# Altium footprint library XU-GENARAL PCB .PcbLib: 1176 footprints (part 19 of 75)
Each footprint in its own frame and in the unit in brackets; x right, y up, seen from the top. Pads: shape width x height; smd on the part's side, far side on the other; paste and mask are expansions set on the pad; w line width, h text height; cw(c..) or ccw(c..) is an arc to the next point about the centre after c.
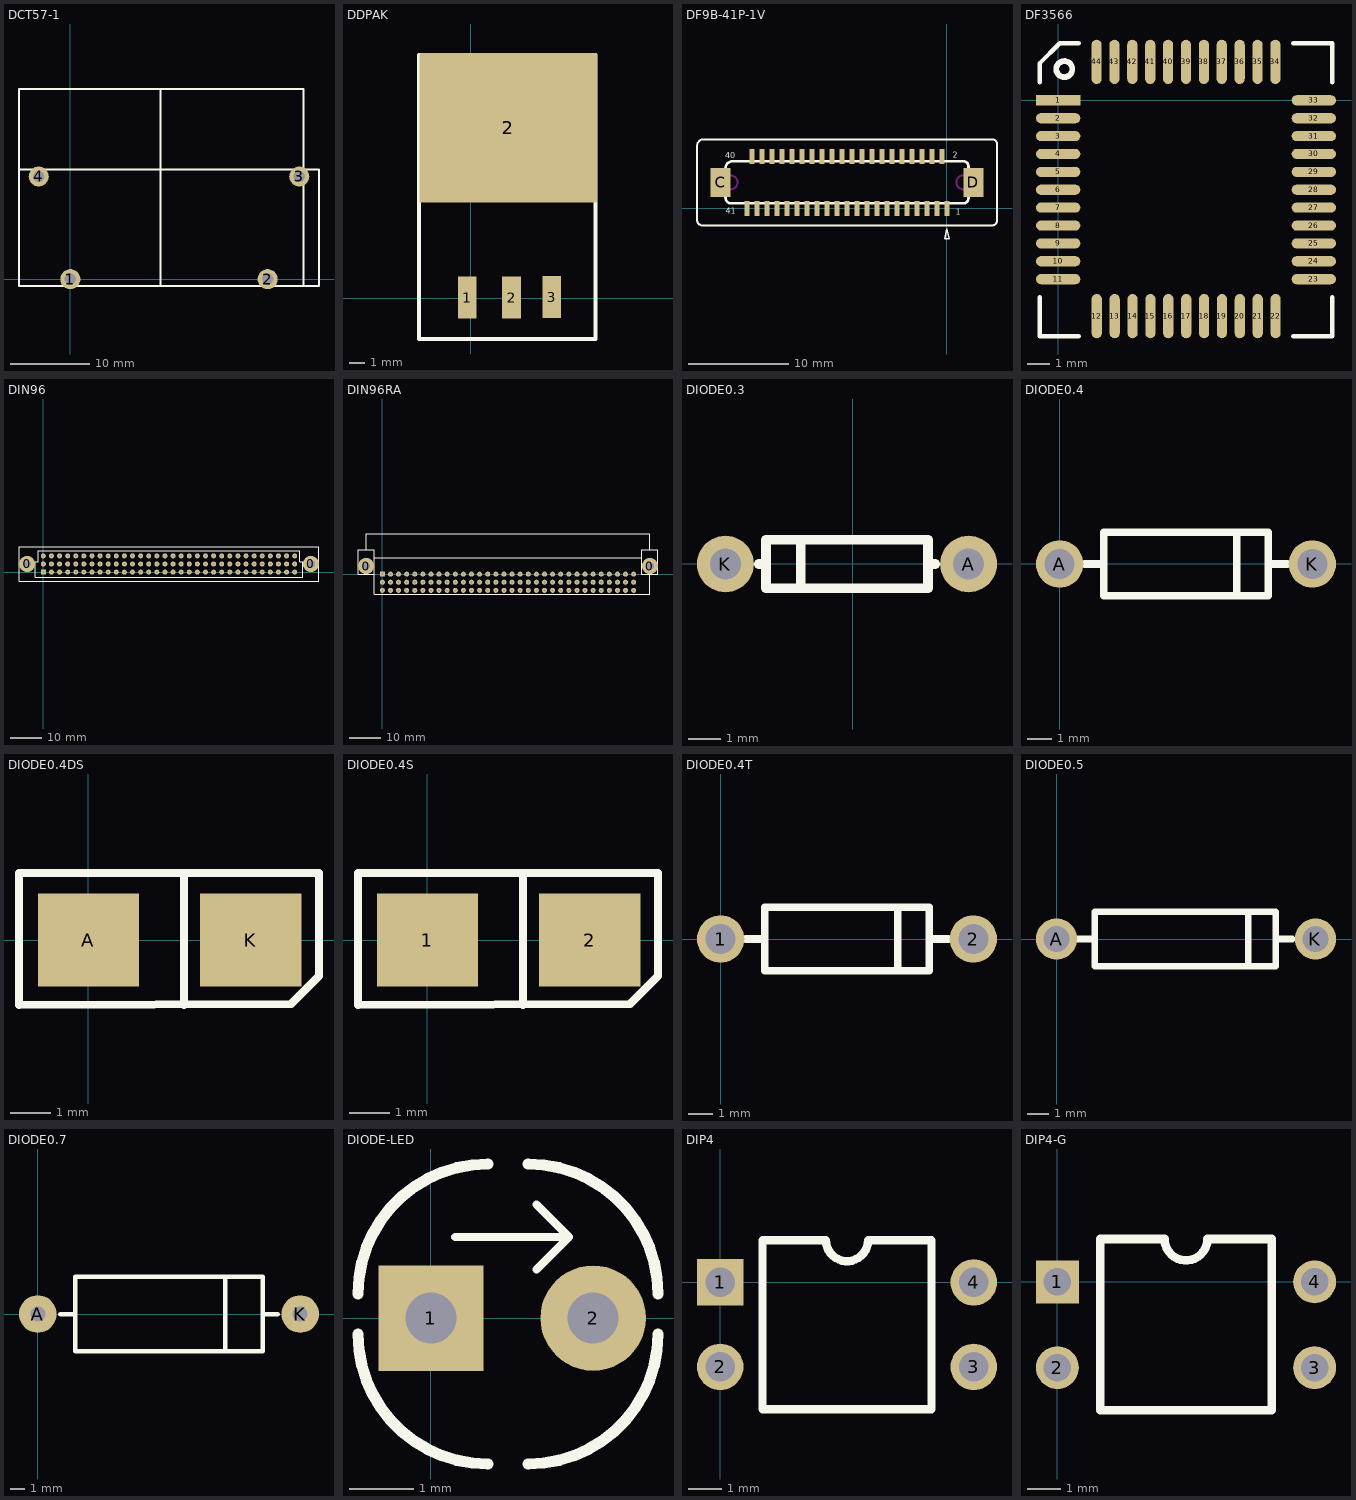
[diagram p18: the footprints below, top view; thin cyan lines are the x and y axes]

## DCT57-1 [mil]
pads (4):
  round 100 hole 56: 1(0,0) 2(984.25,0) 3(1141.73,511.81) 4(-157.48,511.81)
Top Overlay:
  lines w10: 450.1,-35.43 450.1,948.82 ; 1161.42,-35.43 -255.91,-35.43 ; 1162.1,-35.43 1162.1,948.82 -255.91,948.82 -255.91,547.24 ; -255.91,-35.43 -255.91,547.24 ; -255.91,-35.43 1240.16,-35.43 1240.16,547.24 -255.91,547.24

## DDPAK [mil]
pads (4):
  rect 47.24x106.61 smd: 1(-9,1) 2(103,1) 3(205,2)
  rect 450x380 smd: 2(95,432)
Top Overlay:
  lines w10: -132,-104 -132,616 316,616 316,-104 -132,-104

## DF9B-41P-1V [mm]
pads (43):
  rect 0.5x1.5 smd: 1(0,0) 2(-0.5,5.2) 3(-1,0) 4(-1.5,5.2) 5(-2,0) 6(-2.5,5.2) 7(-3,0) 8(-3.5,5.2) 9(-4,0) 10(-4.5,5.2) 11(-5,0) 12(-5.5,5.2) 13(-6,0) 14(-6.5,5.2) 15(-7,0) 16(-7.5,5.2) 17(-8,0) 18(-8.5,5.2) 19(-9,0) 20(-9.5,5.2) 21(-10,0) 22(-10.5,5.2) 23(-11,0) 24(-11.5,5.2) 25(-12,0) 26(-12.5,5.2) 27(-13,0) 28(-13.5,5.2) 29(-14,0) 30(-14.5,5.2) 31(-15,0) 32(-15.5,5.2) 33(-16,0) 34(-16.5,5.2) 35(-17,0) 36(-17.5,5.2) 37(-18,0) 38(-18.5,5.2) 39(-19,0) 40(-19.5,5.2) 41(-20,0)
  rect 2x2.9 smd: C(-22.65,2.6) D(2.65,2.6)
Top Overlay:
  lines w0.127: -0.25,-3.032 0.25,-3.032 0,-2.032 -0.25,-3.032
  lines w0.2: -25,-1.162 ccw(c-24.465,-1.162) -24.465,-1.697 4.526,-1.697 ccw(c4.526,-1.223) 5,-1.223 5,6.43 ccw(c4.527,6.43) 4.527,6.903 -24.339,6.903 ccw(c-24.339,6.242) -25,6.242 -25,-1.162
  lines w0.254: -22.15,1.06 ccw(c-21.59,1.06) -21.59,0.5 1.643,0.5 ccw(c1.643,1.007) 2.15,1.007 2.15,4.2 ccw(c1.65,4.2) 1.65,4.7 -21.462,4.7 ccw(c-21.462,4.012) -22.15,4.012 -22.15,1.06
  text "40" at -22.175,5.025 h0.6
  text "41" at -22.15,-0.55 h0.6
  text "1" at 0.85,-0.625 h0.6
  text "2" at 0.6,5.075 h0.6
Keep-Out Layer:
  circle w0.2: c1.65,2.6 r0.7
  circle w0.2: c-21.65,2.6 r0.7

## DF3566 [mil]
pads (44):
  rect 78x18 smd: 1(0,0)
  oval 78x18 smd: 2(0,-31.5) 3(0,-62.99) 4(0,-94.49) 5(0,-125.98) 6(0,-157.48) 7(0,-188.98) 8(0,-220.47) 9(0,-251.97) 10(0,-283.46) 11(0,-314.96) 23(450.31,-314.96) 24(450.31,-283.46) 25(450.31,-251.97) 26(450.31,-220.47) 27(450.31,-188.98) 28(450.31,-157.48) 29(450.31,-125.98) 30(450.31,-94.49) 31(450.31,-62.99) 32(450.31,-31.5) 33(450.31,0)
  oval 18x78 smd: 12(68.03,-380) 13(99.53,-380) 14(131.02,-380) 15(162.52,-380) 16(194.02,-380) 17(225.51,-380) 18(257.01,-380) 19(288.5,-380) 20(320,-380) 21(351.5,-380) 22(382.99,-380) 34(382.64,67.68) 35(351.14,67.68) 36(319.65,67.68) 37(288.15,67.68) 38(256.65,67.68) 39(225.16,67.68) 40(193.66,67.68) 41(162.17,67.68) 42(130.67,67.68) 43(99.17,67.68) 44(67.68,67.68)
Top Overlay:
  circle w10: c10.86,55 r14.14
  lines w7.87: -32.72,-346.46 -32.72,-415.36 36.18,-415.36 ; -32.72,31.5 -32.72,64.96 2.72,100.39 36.18,100.39 ; 414.13,-415.36 483.03,-415.36 483.03,-346.46 ; 414.13,100.39 483.03,100.39 483.03,31.5

## DIN96 [mil]
pads (98):
  round 200 hole 100: 0(-200,100) 0(3300,100)
  rect 62x62 hole 25: 1A(0,0)
  round 62 hole 25: 1B(0,100) 1C(0,200) 2A(100,0) 2B(100,100) 2C(100,200) 3A(200,0) 3B(200,100) 3C(200,200) 4A(300,0) 4B(300,100) 4C(300,200) 5A(400,0) 5B(400,100) 5C(400,200) 6A(500,0) 6B(500,100) 6C(500,200) 7A(600,0) 7B(600,100) 7C(600,200) 8A(700,0) 8B(700,100) 8C(700,200) 9A(800,0) 9B(800,100) 9C(800,200) 10A(900,0) 10B(900,100) 10C(900,200) 11A(1000,0) 11B(1000,100) 11C(1000,200) 12A(1100,0) 12B(1100,100) 12C(1100,200) 13A(1200,0) 13B(1200,100) 13C(1200,200) 14A(1300,0) 14B(1300,100) 14C(1300,200) 15A(1400,0) 15B(1400,100) 15C(1400,200) 16A(1500,0) 16B(1500,100) 16C(1500,200) 17A(1600,0) 17B(1600,100) 17C(1600,200) 18A(1700,0) 18B(1700,100) 18C(1700,200) 19A(1800,0) 19B(1800,100) 19C(1800,200) 20A(1900,0) 20B(1900,100) 20C(1900,200) 21A(2000,0) 21B(2000,100) 21C(2000,200) 22A(2100,0) 22B(2100,100) 22C(2100,200) 23A(2200,0) 23B(2200,100) 23C(2200,200) 24A(2300,0) 24B(2300,100) 24C(2300,200) 25A(2400,0) 25B(2400,100) 25C(2400,200) 26A(2500,0) 26B(2500,100) 26C(2500,200) 27A(2600,0) 27B(2600,100) 27C(2600,200) 28A(2700,0) 28B(2700,100) 28C(2700,200) 29A(2800,0) 29B(2800,100) 29C(2800,200) 30A(2900,0) 30B(2900,100) 30C(2900,200) 31A(3000,0) 31B(3000,100) 31C(3000,200) 32A(3100,0) 32B(3100,100) 32C(3100,200)
Top Overlay:
  lines w10: -300,-110 3400,-110 3400,310 -300,310 -300,-110 ; -100,-65 3200,-65 3200,130 3165,130 3165,265 -65,265 -65,130 -100,130 -100,-65

## DIN96RA [mil]
pads (98):
  round 200 hole 100: 0(-200,100) 0(3300,100)
  rect 62x62 hole 25: 1A(0,0)
  round 62 hole 25: 1B(0,-100) 1C(0,-200) 2A(100,0) 2B(100,-100) 2C(100,-200) 3A(200,0) 3B(200,-100) 3C(200,-200) 4A(300,0) 4B(300,-100) 4C(300,-200) 5A(400,0) 5B(400,-100) 5C(400,-200) 6A(500,0) 6B(500,-100) 6C(500,-200) 7A(600,0) 7B(600,-100) 7C(600,-200) 8A(700,0) 8B(700,-100) 8C(700,-200) 9A(800,0) 9B(800,-100) 9C(800,-200) 10A(900,0) 10B(900,-100) 10C(900,-200) 11A(1000,0) 11B(1000,-100) 11C(1000,-200) 12A(1100,0) 12B(1100,-100) 12C(1100,-200) 13A(1200,0) 13B(1200,-100) 13C(1200,-200) 14A(1300,0) 14B(1300,-100) 14C(1300,-200) 15A(1400,0) 15B(1400,-100) 15C(1400,-200) 16A(1500,0) 16B(1500,-100) 16C(1500,-200) 17A(1600,0) 17B(1600,-100) 17C(1600,-200) 18A(1700,0) 18B(1700,-100) 18C(1700,-200) 19A(1800,0) 19B(1800,-100) 19C(1800,-200) 20A(1900,0) 20B(1900,-100) 20C(1900,-200) 21A(2000,0) 21B(2000,-100) 21C(2000,-200) 22A(2100,0) 22B(2100,-100) 22C(2100,-200) 23A(2200,0) 23B(2200,-100) 23C(2200,-200) 24A(2300,0) 24B(2300,-100) 24C(2300,-200) 25A(2400,0) 25B(2400,-100) 25C(2400,-200) 26A(2500,0) 26B(2500,-100) 26C(2500,-200) 27A(2600,0) 27B(2600,-100) 27C(2600,-200) 28A(2700,0) 28B(2700,-100) 28C(2700,-200) 29A(2800,0) 29B(2800,-100) 29C(2800,-200) 30A(2900,0) 30B(2900,-100) 30C(2900,-200) 31A(3000,0) 31B(3000,-100) 31C(3000,-200) 32A(3100,0) 32B(3100,-100) 32C(3100,-200)
Top Overlay:
  lines w10: -100,200 3200,200 ; 3300,0 3300,-250 -100,-250 -100,0 ; -200,300 -100,300 -100,0 ; -200,300 -300,300 -300,0 -100,0 ; -200,300 -200,500 3300,500 3300,300 ; 3300,300 3400,300 3400,0 3200,0 3200,300 3300,300

## DIODE0.3 [mil]
pads (2):
  round 70 hole 38: A(142.74,-0.26) K(-157.26,-0.26)
Top Overlay:
  lines w12: -116.26,-0.26 -107.26,-0.26 ; -64.26,-29.26 -64.26,29.74 ; 92.74,-0.26 101.74,-0.26 ; -107.26,-0.26 -107.26,29.74 92.74,29.74 92.74,-30.26 -107.26,-30.26 -107.26,-0.26

## DIODE0.4 [mm]
pads (2):
  round 1.9 hole 1.2: A(-0.004,-0.013) K(10.156,-0.013)
Top Overlay:
  lines w0.305: 1.012,-0.013 1.774,-0.013 ; 7.108,-1.283 7.108,1.257 ; 8.378,-0.013 9.14,-0.013 ; 1.774,-1.283 1.774,1.257 8.378,1.257 8.378,-1.283 1.774,-1.283

## DIODE0.4DS [mm]
pads (2):
  rect 2.5x2.286 smd: A(0,0) K(4,0)
Top Overlay:
  lines w0.2: 2.356,-1.6 2.356,1.651 ; 4.997,-1.575 -1.708,-1.6 -1.713,0 -1.708,1.651 5.683,1.651 5.683,-0.838
  lines w0.203: 4.997,-1.575 5.683,-0.889 5.683,-0.838

## DIODE0.4S [mm]
pads (2):
  rect 2.5x2.286 smd: 1(0,0) 2(4,0)
Top Overlay:
  lines w0.2: 2.356,-1.6 2.356,1.651 ; 4.997,-1.575 -1.708,-1.6 -1.713,0 -1.708,1.651 5.683,1.651 5.683,-0.838
  lines w0.203: 4.997,-1.575 5.683,-0.889 5.683,-0.838

## DIODE0.4T [mm]
pads (2):
  round 1.9 hole 1.2: 1(0,0) 2(10.16,0)
Top Overlay:
  lines w0.305: 1.016,0 1.778,0 ; 7.112,-1.27 7.112,1.27 ; 8.382,0 9.144,0 ; 1.778,-1.27 8.382,-1.27 8.382,1.27 1.778,1.27 1.778,-1.27

## DIODE0.5 [mm]
pads (2):
  round 1.9 hole 1.2: A(0,0) K(12,0)
Top Overlay:
  lines w0.305: 1.016,0 1.778,0 ; 8.89,-1.27 8.89,1.27 ; 10.16,0 10.922,0 ; 1.778,-1.27 10.16,-1.27 10.16,1.27 1.778,1.27 1.778,-1.27

## DIODE0.7 [mil]
pads (2):
  round 100 hole 40: A(0,0) K(700,0)
Top Overlay:
  lines w12: 60,0 100,0 ; 500,-100 500,100 ; 600,0 640,0 ; 100,-100 100,100 600,100 600,-100 100,-100

## DIODE-LED [mil]
pads (2):
  rect 65x65 hole 31.5: 1(0,0)
  round 65 hole 31.5: 2(100,0)
Top Overlay:
  lines w5: 15,50 85,50 ; 65,30 85,50 ; 65,70 85,50
  lines w7: -45,-10 ccw(c35,-10) 35,-90 ; -45,15 cw(c35,15) 35,95 ; 60,-90 ccw(c60,-10) 140,-10 ; 60,95 cw(c60,15) 140,15

## DIP4 [mil]
pads (4):
  rect 55x55 hole 35: 1(0,0)
  round 55 hole 35: 2(0,-100) 3(300,-100) 4(300,0)
Top Overlay:
  lines w10: 50,-150 250,-150 250,50 175,50 cw(c150,50) 125,50 50,50 50,-150

## DIP4-G [mil]
pads (4):
  rect 50x50 hole 32: 1(0,0)
  round 50 hole 32: 2(0,-100) 3(300,-100) 4(300,0)
Top Overlay:
  lines w10: 50,-150 50,50 125,50 ccw(c150,50) 175,50 250,50 250,-150 50,-150